# Altium footprint library IC_QFN.PcbLib: 25 footprints (part 2 of 3)
Each footprint in its own frame and in the unit in brackets; x right, y up, seen from the top. Pads: shape width x height; smd on the part's side, far side on the other; paste and mask are expansions set on the pad; w line width, h text height; cw(c..) or ccw(c..) is an arc to the next point about the centre after c.
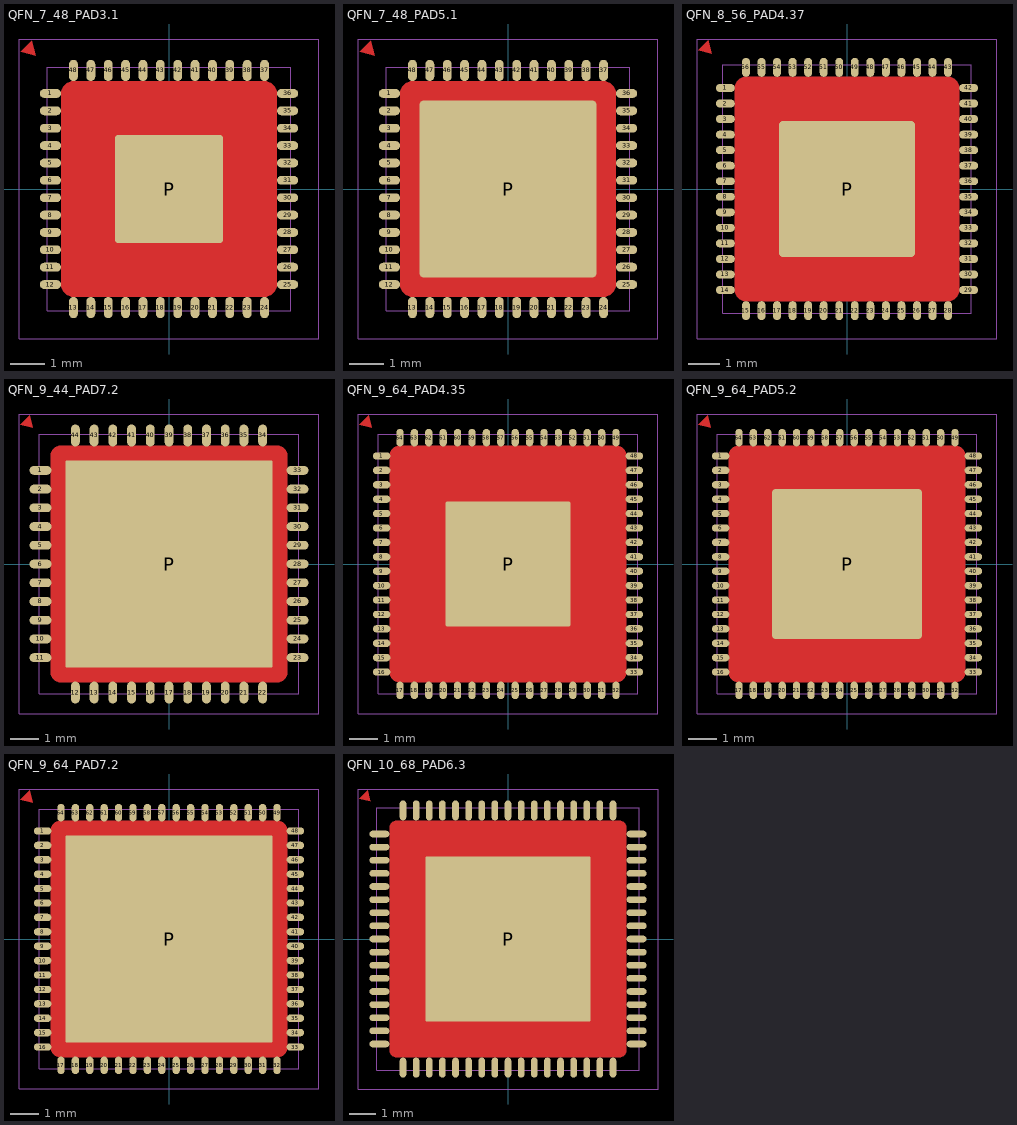
[diagram p1: the footprints below, top view; thin cyan lines are the x and y axes]

## QFN_7_48_PAD3.1 [mm]
pads (49):
  oval 0.61x0.254 smd mask+0.051: 1(-3.413,2.75) 2(-3.413,2.25) 3(-3.413,1.75) 4(-3.413,1.25) 5(-3.413,0.75) 6(-3.413,0.25) 7(-3.413,-0.25) 8(-3.413,-0.75) 9(-3.413,-1.25) 10(-3.413,-1.75) 11(-3.413,-2.25) 12(-3.413,-2.75) 25(3.413,-2.75) 26(3.413,-2.25) 27(3.413,-1.75) 28(3.413,-1.25) 29(3.413,-0.75) 30(3.413,-0.25) 31(3.413,0.25) 32(3.413,0.75) 33(3.413,1.25) 34(3.413,1.75) 35(3.413,2.25) 36(3.413,2.75)
  oval 0.254x0.61 smd mask+0.051: 13(-2.75,-3.413) 14(-2.25,-3.413) 15(-1.75,-3.413) 16(-1.25,-3.413) 17(-0.75,-3.413) 18(-0.25,-3.413) 19(0.25,-3.413) 20(0.75,-3.413) 21(1.25,-3.413) 22(1.75,-3.413) 23(2.25,-3.413) 24(2.75,-3.413) 37(2.75,3.413) 38(2.25,3.413) 39(1.75,3.413) 40(1.25,3.413) 41(0.75,3.413) 42(0.25,3.413) 43(-0.25,3.413) 44(-0.75,3.413) 45(-1.25,3.413) 46(-1.75,3.413) 47(-2.25,3.413) 48(-2.75,3.413)
  rrect5% 3.1x3.1 smd paste-7.62 mask+0.051: P(0,0)
Top Layer:
  region: -3.842,3.842 -3.95,4.273 -4.273,3.95
  pour cut-out: -2.75,3.099 -2.819,3.099 -2.948,3.046 -3.046,2.948 -3.099,2.819 -3.099,2.75 -3.099,-2.75 -3.099,-2.819 -3.046,-2.948 -2.948,-3.046 -2.819,-3.099 -2.75,-3.099 2.75,-3.099 2.819,-3.099 2.948,-3.046 3.046,-2.948 3.099,-2.819 3.099,-2.75 3.099,2.75 3.099,2.819 3.046,2.948 2.948,3.046 2.819,3.099 2.75,3.099
Top Paste:
  rectangle: -0.432,-0.432 0.432,0.432
  rectangle: -0.432,0.635 0.432,1.499
  rectangle: 0.635,-0.432 1.499,0.432
  rectangle: 0.635,0.635 1.499,1.499
  region: -0.635,0.635 -0.635,1.499 -1.499,1.499 -1.499,0.635
  region: -0.635,0.432 -1.499,0.432 -1.499,-0.432 -0.635,-0.432
  region: -0.635,-0.635 -1.499,-0.635 -1.499,-1.499 -0.635,-1.499
  region: -0.432,-0.635 -0.432,-1.499 0.432,-1.499 0.432,-0.635
  region: 0.635,-0.635 0.635,-1.499 1.499,-1.499 1.499,-0.635
Top Component Outline:
  lines w0.025: -4.318,-4.318 4.318,-4.318 4.318,4.318 -4.318,4.318 -4.318,-4.318
Top 3D Body (Mech16):
  lines w0.025: -3.5,-3.5 3.5,-3.5 3.5,3.5 -3.5,3.5 -3.5,-3.5
3D body: height 0.25, standoff 0, extent -3.525,2.623 -3.271,2.877
3D body: height 0.89, standoff 0, extent -3.5,-3.5 3.5,3.5
3D body: height 0.25, standoff 0, extent -3.525,2.123 -3.271,2.377
3D body: height 0.25, standoff 0, extent -3.525,1.623 -3.271,1.877
3D body: height 0.25, standoff 0, extent -3.525,1.123 -3.271,1.377
3D body: height 0.25, standoff 0, extent -3.525,0.623 -3.271,0.877
3D body: height 0.25, standoff 0, extent -3.525,0.123 -3.271,0.377
3D body: height 0.25, standoff 0, extent -3.525,-0.377 -3.271,-0.123
3D body: height 0.25, standoff 0, extent -3.525,-0.877 -3.271,-0.623
3D body: height 0.25, standoff 0, extent -3.525,-1.377 -3.271,-1.123
3D body: height 0.25, standoff 0, extent -3.525,-1.877 -3.271,-1.623
3D body: height 0.25, standoff 0, extent -3.525,-2.377 -3.271,-2.123
3D body: height 0.25, standoff 0, extent -3.525,-2.877 -3.271,-2.623
3D body: height 0.25, standoff 0, extent 2.623,-3.525 2.877,-3.271
3D body: height 0.25, standoff 0, extent 2.123,-3.525 2.377,-3.271
3D body: height 0.25, standoff 0, extent 1.623,-3.525 1.877,-3.271
3D body: height 0.25, standoff 0, extent 1.123,-3.525 1.377,-3.271
3D body: height 0.25, standoff 0, extent 0.623,-3.525 0.877,-3.271
3D body: height 0.25, standoff 0, extent 0.123,-3.525 0.377,-3.271
3D body: height 0.25, standoff 0, extent -0.377,-3.525 -0.123,-3.271
3D body: height 0.25, standoff 0, extent -0.877,-3.525 -0.623,-3.271
3D body: height 0.25, standoff 0, extent -1.377,-3.525 -1.123,-3.271
3D body: height 0.25, standoff 0, extent -1.877,-3.525 -1.623,-3.271
3D body: height 0.25, standoff 0, extent -2.377,-3.525 -2.123,-3.271
3D body: height 0.25, standoff 0, extent -2.877,-3.525 -2.623,-3.271
3D body: height 0.25, standoff 0, extent 3.271,2.623 3.525,2.877
3D body: height 0.25, standoff 0, extent 3.271,2.123 3.525,2.377
3D body: height 0.25, standoff 0, extent 3.271,1.623 3.525,1.877
3D body: height 0.25, standoff 0, extent 3.271,1.123 3.525,1.377
3D body: height 0.25, standoff 0, extent 3.271,0.623 3.525,0.877
3D body: height 0.25, standoff 0, extent 3.271,0.123 3.525,0.377
3D body: height 0.25, standoff 0, extent 3.271,-0.377 3.525,-0.123
3D body: height 0.25, standoff 0, extent 3.271,-0.877 3.525,-0.623
3D body: height 0.25, standoff 0, extent 3.271,-1.377 3.525,-1.123
3D body: height 0.25, standoff 0, extent 3.271,-1.877 3.525,-1.623
3D body: height 0.25, standoff 0, extent 3.271,-2.377 3.525,-2.123
3D body: height 0.25, standoff 0, extent 3.271,-2.877 3.525,-2.623
3D body: height 0.25, standoff 0, extent -2.877,3.271 -2.623,3.525
3D body: height 0.25, standoff 0, extent -2.377,3.271 -2.123,3.525
3D body: height 0.25, standoff 0, extent -1.877,3.271 -1.623,3.525
3D body: height 0.25, standoff 0, extent -1.377,3.271 -1.123,3.525
3D body: height 0.25, standoff 0, extent -0.877,3.271 -0.623,3.525
3D body: height 0.25, standoff 0, extent -0.377,3.271 -0.123,3.525
3D body: height 0.25, standoff 0, extent 0.123,3.271 0.377,3.525
3D body: height 0.25, standoff 0, extent 0.623,3.271 0.877,3.525
3D body: height 0.25, standoff 0, extent 1.123,3.271 1.377,3.525
3D body: height 0.25, standoff 0, extent 1.623,3.271 1.877,3.525
3D body: height 0.25, standoff 0, extent 2.123,3.271 2.377,3.525
3D body: height 0.25, standoff 0, extent 2.623,3.271 2.877,3.525

## QFN_7_48_PAD5.1 [mm]
pads (49):
  oval 0.61x0.254 smd mask+0.051: 1(-3.413,2.75) 2(-3.413,2.25) 3(-3.413,1.75) 4(-3.413,1.25) 5(-3.413,0.75) 6(-3.413,0.25) 7(-3.413,-0.25) 8(-3.413,-0.75) 9(-3.413,-1.25) 10(-3.413,-1.75) 11(-3.413,-2.25) 12(-3.413,-2.75) 25(3.413,-2.75) 26(3.413,-2.25) 27(3.413,-1.75) 28(3.413,-1.25) 29(3.413,-0.75) 30(3.413,-0.25) 31(3.413,0.25) 32(3.413,0.75) 33(3.413,1.25) 34(3.413,1.75) 35(3.413,2.25) 36(3.413,2.75)
  oval 0.254x0.61 smd mask+0.051: 13(-2.75,-3.413) 14(-2.25,-3.413) 15(-1.75,-3.413) 16(-1.25,-3.413) 17(-0.75,-3.413) 18(-0.25,-3.413) 19(0.25,-3.413) 20(0.75,-3.413) 21(1.25,-3.413) 22(1.75,-3.413) 23(2.25,-3.413) 24(2.75,-3.413) 37(2.75,3.413) 38(2.25,3.413) 39(1.75,3.413) 40(1.25,3.413) 41(0.75,3.413) 42(0.25,3.413) 43(-0.25,3.413) 44(-0.75,3.413) 45(-1.25,3.413) 46(-1.75,3.413) 47(-2.25,3.413) 48(-2.75,3.413)
  rrect5% 5.1x5.1 smd paste-7.62 mask+0.051: P(0,0)
Top Layer:
  pour cut-out: -2.75,3.099 -2.819,3.099 -2.948,3.046 -3.046,2.948 -3.099,2.819 -3.099,2.75 -3.099,-2.75 -3.099,-2.819 -3.046,-2.948 -2.948,-3.046 -2.819,-3.099 -2.75,-3.099 2.75,-3.099 2.819,-3.099 2.948,-3.046 3.046,-2.948 3.099,-2.819 3.099,-2.75 3.099,2.75 3.099,2.819 3.046,2.948 2.948,3.046 2.819,3.099 2.75,3.099
  region: -3.842,3.842 -3.95,4.273 -4.273,3.95
Top Paste:
  rectangle: -0.635,-0.635 0.635,0.635
  rectangle: -0.635,1.016 0.635,2.286
  rectangle: -2.286,1.016 -1.016,2.286
  region: -1.016,-2.286 -1.016,-1.016 -2.286,-1.016 -2.286,-2.286
  region: -1.016,-0.635 -1.016,0.635 -2.286,0.635 -2.286,-0.635
  region: 2.286,-1.016 1.016,-1.016 1.016,-2.286 2.286,-2.286
  region: 0.635,-1.016 -0.635,-1.016 -0.635,-2.286 0.635,-2.286
  region: 1.016,2.286 1.016,1.016 2.286,1.016 2.286,2.286
  region: 1.016,0.635 1.016,-0.635 2.286,-0.635 2.286,0.635
Top Component Outline:
  lines w0.025: -4.318,-4.318 -4.318,4.318 4.318,4.318 4.318,-4.318 -4.318,-4.318
Top 3D Body (Mech16):
  lines w0.025: -3.5,-3.5 -3.5,3.5 3.5,3.5 3.5,-3.5 -3.5,-3.5
3D body: height 0.25, standoff 0, extent 2.623,3.271 2.877,3.525
3D body: height 0.25, standoff 0, extent 2.123,3.271 2.377,3.525
3D body: height 0.25, standoff 0, extent 1.623,3.271 1.877,3.525
3D body: height 0.25, standoff 0, extent 1.123,3.271 1.377,3.525
3D body: height 0.25, standoff 0, extent 0.623,3.271 0.877,3.525
3D body: height 0.25, standoff 0, extent 0.123,3.271 0.377,3.525
3D body: height 0.25, standoff 0, extent -0.377,3.271 -0.123,3.525
3D body: height 0.25, standoff 0, extent -0.877,3.271 -0.623,3.525
3D body: height 0.25, standoff 0, extent -1.377,3.271 -1.123,3.525
3D body: height 0.25, standoff 0, extent -1.877,3.271 -1.623,3.525
3D body: height 0.25, standoff 0, extent -2.377,3.271 -2.123,3.525
3D body: height 0.25, standoff 0, extent -2.877,3.271 -2.623,3.525
3D body: height 0.25, standoff 0, extent 3.271,-2.877 3.525,-2.623
3D body: height 0.25, standoff 0, extent 3.271,-2.377 3.525,-2.123
3D body: height 0.25, standoff 0, extent 3.271,-1.877 3.525,-1.623
3D body: height 0.25, standoff 0, extent 3.271,-1.377 3.525,-1.123
3D body: height 0.25, standoff 0, extent 3.271,-0.877 3.525,-0.623
3D body: height 0.25, standoff 0, extent 3.271,-0.377 3.525,-0.123
3D body: height 0.25, standoff 0, extent 3.271,0.123 3.525,0.377
3D body: height 0.25, standoff 0, extent 3.271,0.623 3.525,0.877
3D body: height 0.25, standoff 0, extent 3.271,1.123 3.525,1.377
3D body: height 0.25, standoff 0, extent 3.271,1.623 3.525,1.877
3D body: height 0.25, standoff 0, extent 3.271,2.123 3.525,2.377
3D body: height 0.25, standoff 0, extent 3.271,2.623 3.525,2.877
3D body: height 0.25, standoff 0, extent -2.877,-3.525 -2.623,-3.271
3D body: height 0.25, standoff 0, extent -2.377,-3.525 -2.123,-3.271
3D body: height 0.25, standoff 0, extent -1.877,-3.525 -1.623,-3.271
3D body: height 0.25, standoff 0, extent -1.377,-3.525 -1.123,-3.271
3D body: height 0.25, standoff 0, extent -0.877,-3.525 -0.623,-3.271
3D body: height 0.25, standoff 0, extent -0.377,-3.525 -0.123,-3.271
3D body: height 0.25, standoff 0, extent 0.123,-3.525 0.377,-3.271
3D body: height 0.25, standoff 0, extent 0.623,-3.525 0.877,-3.271
3D body: height 0.25, standoff 0, extent 1.123,-3.525 1.377,-3.271
3D body: height 0.25, standoff 0, extent 1.623,-3.525 1.877,-3.271
3D body: height 0.25, standoff 0, extent 2.123,-3.525 2.377,-3.271
3D body: height 0.25, standoff 0, extent 2.623,-3.525 2.877,-3.271
3D body: height 0.25, standoff 0, extent -3.525,-2.877 -3.271,-2.623
3D body: height 0.25, standoff 0, extent -3.525,-2.377 -3.271,-2.123
3D body: height 0.25, standoff 0, extent -3.525,-1.877 -3.271,-1.623
3D body: height 0.25, standoff 0, extent -3.525,-1.377 -3.271,-1.123
3D body: height 0.25, standoff 0, extent -3.525,-0.877 -3.271,-0.623
3D body: height 0.25, standoff 0, extent -3.525,-0.377 -3.271,-0.123
3D body: height 0.25, standoff 0, extent -3.525,0.123 -3.271,0.377
3D body: height 0.25, standoff 0, extent -3.525,0.623 -3.271,0.877
3D body: height 0.25, standoff 0, extent -3.525,1.123 -3.271,1.377
3D body: height 0.25, standoff 0, extent -3.525,1.623 -3.271,1.877
3D body: height 0.25, standoff 0, extent -3.525,2.123 -3.271,2.377
3D body: height 0.89, standoff 0, extent -3.5,-3.5 3.5,3.5
3D body: height 0.25, standoff 0, extent -3.525,2.623 -3.271,2.877

## QFN_8_56_PAD4.37 [mm]
pads (57):
  oval 0.61x0.254 smd paste+0 mask+0.051: 1(-3.913,3.25) 2(-3.913,2.75) 3(-3.913,2.25) 4(-3.913,1.75) 5(-3.913,1.25) 6(-3.913,0.75) 7(-3.913,0.25) 8(-3.913,-0.25) 9(-3.913,-0.75) 10(-3.913,-1.25) 11(-3.913,-1.75) 12(-3.913,-2.25) 13(-3.913,-2.75) 14(-3.913,-3.25) 29(3.913,-3.25) 30(3.913,-2.75) 31(3.913,-2.25) 32(3.913,-1.75) 33(3.913,-1.25) 34(3.913,-0.75) 35(3.913,-0.25) 36(3.913,0.25) 37(3.913,0.75) 38(3.913,1.25) 39(3.913,1.75) 40(3.913,2.25) 41(3.913,2.75) 42(3.913,3.25)
  oval 0.254x0.61 smd paste+0 mask+0.051: 15(-3.25,-3.913) 16(-2.75,-3.913) 17(-2.25,-3.913) 18(-1.75,-3.913) 19(-1.25,-3.913) 20(-0.75,-3.913) 21(-0.25,-3.913) 22(0.25,-3.913) 23(0.75,-3.913) 24(1.25,-3.913) 25(1.75,-3.913) 26(2.25,-3.913) 27(2.75,-3.913) 28(3.25,-3.913) 43(3.25,3.913) 44(2.75,3.913) 45(2.25,3.913) 46(1.75,3.913) 47(1.25,3.913) 48(0.75,3.913) 49(0.25,3.913) 50(-0.25,3.913) 51(-0.75,3.913) 52(-1.25,3.913) 53(-1.75,3.913) 54(-2.25,3.913) 55(-2.75,3.913) 56(-3.25,3.913)
  rrect5% 4.37x4.37 smd paste-5.08 mask+0.051: P(0,0)
Top Layer:
  region: -4.35,4.35 -4.458,4.781 -4.781,4.458
  pour cut-out: -3.25,3.607 -3.321,3.607 -3.452,3.552 -3.552,3.452 -3.607,3.321 -3.607,3.25 -3.607,-3.25 -3.607,-3.321 -3.552,-3.452 -3.452,-3.552 -3.321,-3.607 -3.25,-3.607 3.25,-3.607 3.321,-3.607 3.452,-3.552 3.552,-3.452 3.607,-3.321 3.607,-3.25 3.607,3.25 3.607,3.321 3.552,3.452 3.452,3.552 3.321,3.607 3.25,3.607
Top Paste:
  region: 1.016,0.635 1.016,-0.635 2.032,-0.635 2.032,0.635
  region: 1.016,2.032 1.016,1.016 2.032,1.016 2.032,2.032
  region: 0.635,-1.016 -0.635,-1.016 -0.635,-2.032 0.635,-2.032
  region: 2.032,-1.016 1.016,-1.016 1.016,-2.032 2.032,-2.032
  region: -1.016,-0.635 -1.016,0.635 -2.032,0.635 -2.032,-0.635
  region: -1.016,-2.032 -1.016,-1.016 -2.032,-1.016 -2.032,-2.032
  rectangle: -2.032,1.016 -1.016,2.032
  rectangle: -0.635,1.016 0.635,2.032
  rectangle: -0.635,-0.635 0.635,0.635
Top Component Outline:
  lines w0.025: -4.826,-4.826 4.826,-4.826 4.826,4.826 -4.826,4.826 -4.826,-4.826
Top 3D Body (Mech16):
  lines w0.025: -4,-4 4,-4 4,4 -4,4 -4,-4
3D body: height 0.89, standoff 0, extent -4,-4 4,4
3D body: height 0.25, standoff 0, extent 3.759,-2.377 4.013,-2.123
3D body: height 0.25, standoff 0, extent 3.759,-1.877 4.013,-1.623
3D body: height 0.25, standoff 0, extent 3.759,-1.377 4.013,-1.123
3D body: height 0.25, standoff 0, extent 3.759,-0.877 4.013,-0.623
3D body: height 0.25, standoff 0, extent 3.759,-0.377 4.013,-0.123
3D body: height 0.25, standoff 0, extent 3.759,0.123 4.013,0.377
3D body: height 0.25, standoff 0, extent 3.759,0.623 4.013,0.877
3D body: height 0.25, standoff 0, extent 3.759,1.123 4.013,1.377
3D body: height 0.25, standoff 0, extent 3.759,1.623 4.013,1.877
3D body: height 0.25, standoff 0, extent 3.759,2.123 4.013,2.377
3D body: height 0.25, standoff 0, extent 3.759,2.623 4.013,2.877
3D body: height 0.25, standoff 0, extent 3.759,3.123 4.013,3.377
3D body: height 0.25, standoff 0, extent 3.759,-2.878 4.013,-2.624
3D body: height 0.25, standoff 0, extent 3.759,-3.378 4.013,-3.124
3D body: height 0.25, standoff 0, extent 3.124,3.759 3.378,4.013
3D body: height 0.25, standoff 0, extent 2.624,3.759 2.878,4.013
3D body: height 0.25, standoff 0, extent -3.377,3.759 -3.123,4.013
3D body: height 0.25, standoff 0, extent -2.877,3.759 -2.623,4.013
3D body: height 0.25, standoff 0, extent -2.377,3.759 -2.123,4.013
3D body: height 0.25, standoff 0, extent -1.877,3.759 -1.623,4.013
3D body: height 0.25, standoff 0, extent -1.377,3.759 -1.123,4.013
3D body: height 0.25, standoff 0, extent -0.877,3.759 -0.623,4.013
3D body: height 0.25, standoff 0, extent -0.377,3.759 -0.123,4.013
3D body: height 0.25, standoff 0, extent 0.123,3.759 0.377,4.013
3D body: height 0.25, standoff 0, extent 0.623,3.759 0.877,4.013
3D body: height 0.25, standoff 0, extent 1.123,3.759 1.377,4.013
3D body: height 0.25, standoff 0, extent 1.623,3.759 1.877,4.013
3D body: height 0.25, standoff 0, extent 2.123,3.759 2.377,4.013
3D body: height 0.25, standoff 0, extent -4.013,3.124 -3.759,3.378
3D body: height 0.25, standoff 0, extent -4.013,2.624 -3.759,2.878
3D body: height 0.25, standoff 0, extent -4.013,-3.377 -3.759,-3.123
3D body: height 0.25, standoff 0, extent -4.013,-2.877 -3.759,-2.623
3D body: height 0.25, standoff 0, extent -4.013,-2.377 -3.759,-2.123
3D body: height 0.25, standoff 0, extent -4.013,-1.877 -3.759,-1.623
3D body: height 0.25, standoff 0, extent -4.013,-1.377 -3.759,-1.123
3D body: height 0.25, standoff 0, extent -4.013,-0.877 -3.759,-0.623
3D body: height 0.25, standoff 0, extent -4.013,-0.377 -3.759,-0.123
3D body: height 0.25, standoff 0, extent -4.013,0.123 -3.759,0.377
3D body: height 0.25, standoff 0, extent -4.013,0.623 -3.759,0.877
3D body: height 0.25, standoff 0, extent -4.013,1.123 -3.759,1.377
3D body: height 0.25, standoff 0, extent -4.013,1.623 -3.759,1.877
3D body: height 0.25, standoff 0, extent -4.013,2.123 -3.759,2.377
3D body: height 0.25, standoff 0, extent -3.378,-4.013 -3.124,-3.759
3D body: height 0.25, standoff 0, extent -2.878,-4.013 -2.624,-3.759
3D body: height 0.25, standoff 0, extent 3.123,-4.013 3.377,-3.759
3D body: height 0.25, standoff 0, extent 2.623,-4.013 2.877,-3.759
3D body: height 0.25, standoff 0, extent 2.123,-4.013 2.377,-3.759
3D body: height 0.25, standoff 0, extent 1.623,-4.013 1.877,-3.759
3D body: height 0.25, standoff 0, extent 1.123,-4.013 1.377,-3.759
3D body: height 0.25, standoff 0, extent 0.623,-4.013 0.877,-3.759
3D body: height 0.25, standoff 0, extent 0.123,-4.013 0.377,-3.759
3D body: height 0.25, standoff 0, extent -0.377,-4.013 -0.123,-3.759
3D body: height 0.25, standoff 0, extent -0.877,-4.013 -0.623,-3.759
3D body: height 0.25, standoff 0, extent -1.377,-4.013 -1.123,-3.759
3D body: height 0.25, standoff 0, extent -1.877,-4.013 -1.623,-3.759
3D body: height 0.25, standoff 0, extent -2.377,-4.013 -2.123,-3.759

## QFN_9_44_PAD7.2 [mil]
pads (45):
  oval 30x12 smd mask+2: 1(-175.69,127.95) 2(-175.69,102.36) 3(-175.69,76.77) 4(-175.69,51.18) 5(-175.69,25.59) 6(-175.69,0) 7(-175.69,-25.59) 8(-175.69,-51.18) 9(-175.69,-76.77) 10(-175.69,-102.36) 11(-175.69,-127.95) 23(175.69,-127.95) 24(175.69,-102.36) 25(175.69,-76.77) 26(175.69,-51.18) 27(175.69,-25.59) 28(175.69,0) 29(175.69,25.59) 30(175.69,51.18) 31(175.69,76.77) 32(175.69,102.36) 33(175.69,127.95)
  oval 12x30 smd mask+2: 12(-127.95,-175.69) 13(-102.36,-175.69) 14(-76.77,-175.69) 15(-51.18,-175.69) 16(-25.59,-175.69) 17(0,-175.69) 18(25.59,-175.69) 19(51.18,-175.69) 20(76.77,-175.69) 21(102.36,-175.69) 22(127.95,-175.69) 34(127.95,175.69) 35(102.36,175.69) 36(76.77,175.69) 37(51.18,175.69) 38(25.59,175.69) 39(0,175.69) 40(-25.59,175.69) 41(-51.18,175.69) 42(-76.77,175.69) 43(-102.36,175.69) 44(-127.95,175.69)
  rrect2% 283.46x283.46 smd paste-500 mask+2: P(0,0)
Top Layer:
  pour cut-out: 147.64,161.42 150.38,161.42 155.44,159.32 159.32,155.44 161.42,150.38 161.42,147.64 161.42,-147.64 161.42,-150.38 159.32,-155.44 155.44,-159.32 150.38,-161.42 147.64,-161.42 -147.64,-161.42 -150.38,-161.42 -155.44,-159.32 -159.32,-155.44 -161.42,-150.38 -161.42,-147.64 -161.42,147.64 -161.42,150.38 -159.32,155.44 -155.44,159.32 -150.38,161.42 -147.64,161.42
  region: -186.26,186.26 -190.5,203.23 -203.23,190.51
Top Paste:
  rectangle: -20,-20 20,20
  rectangle: 30,-20 70,20
  rectangle: 30,-70 70,-30
  rectangle: -20,-70 20,-30
  rectangle: -20,-130 20,-90
  rectangle: 30,-130 70,-90
  region: 70,30 70,70 30,70 30,30
  region: -30,70 -70,70 -70,30 -30,30
  region: -130,-90 -130,-130 -90,-130 -90,-90
  region: -70,-30 -70,-70 -30,-70 -30,-30
  region: -70,-90 -70,-130 -30,-130 -30,-90
  region: 20,70 -20,70 -20,30 20,30
  region: -70,20 -70,-20 -30,-20 -30,20
  rectangle: 90,-70 130,-30
  rectangle: 90,-130 130,-90
  region: 130,30 130,70 90,70 90,30
  region: 130,-20 130,20 90,20 90,-20
  region: 70,90 70,130 30,130 30,90
  region: 130,90 130,130 90,130 90,90
  region: -30,130 -70,130 -70,90 -30,90
  region: 20,130 -20,130 -20,90 20,90
  region: -90,70 -130,70 -130,30 -90,30
  region: -90,130 -130,130 -130,90 -90,90
  region: -130,-30 -130,-70 -90,-70 -90,-30
  region: -130,20 -130,-20 -90,-20 -90,20
Top Component Outline:
  lines w1: -205,-205 -205,205 205,205 205,-205 -205,-205
Top 3D Body (Mech16):
  lines w1: -177.17,-177.17 -177.17,177.17 177.17,177.17 177.17,-177.17 -177.17,-177.17
3D body: height 10, standoff 0, extent 122.95,167.74 132.95,177.74
3D body: height 10, standoff 0, extent 97.36,167.74 107.36,177.74
3D body: height 10, standoff 0, extent 71.77,167.74 81.77,177.74
3D body: height 10, standoff 0, extent 46.18,167.74 56.18,177.74
3D body: height 10, standoff 0, extent 20.59,167.74 30.59,177.74
3D body: height 10, standoff 0, extent -5,167.74 5,177.74
3D body: height 10, standoff 0, extent -132.95,167.74 -122.95,177.74
3D body: height 10, standoff 0, extent -107.36,167.74 -97.36,177.74
3D body: height 10, standoff 0, extent -81.77,167.74 -71.77,177.74
3D body: height 10, standoff 0, extent -56.18,167.74 -46.18,177.74
3D body: height 10, standoff 0, extent -30.59,167.74 -20.59,177.74
3D body: height 10, standoff 0, extent 167.74,-132.95 177.74,-122.95
3D body: height 10, standoff 0, extent 167.74,-107.36 177.74,-97.36
3D body: height 10, standoff 0, extent 167.74,-81.77 177.74,-71.77
3D body: height 10, standoff 0, extent 167.74,-56.18 177.74,-46.18
3D body: height 10, standoff 0, extent 167.74,-30.59 177.74,-20.59
3D body: height 10, standoff 0, extent 167.74,-5 177.74,5
3D body: height 10, standoff 0, extent 167.74,122.95 177.74,132.95
3D body: height 10, standoff 0, extent 167.74,97.36 177.74,107.36
3D body: height 10, standoff 0, extent 167.74,71.77 177.74,81.77
3D body: height 10, standoff 0, extent 167.74,46.18 177.74,56.18
3D body: height 10, standoff 0, extent 167.74,20.59 177.74,30.59
3D body: height 10, standoff 0, extent -132.95,-177.74 -122.95,-167.74
3D body: height 10, standoff 0, extent -107.36,-177.74 -97.36,-167.74
3D body: height 10, standoff 0, extent -81.77,-177.74 -71.77,-167.74
3D body: height 10, standoff 0, extent -56.18,-177.74 -46.18,-167.74
3D body: height 10, standoff 0, extent -30.59,-177.74 -20.59,-167.74
3D body: height 10, standoff 0, extent -5,-177.74 5,-167.74
3D body: height 10, standoff 0, extent 122.95,-177.74 132.95,-167.74
3D body: height 10, standoff 0, extent 97.36,-177.74 107.36,-167.74
3D body: height 10, standoff 0, extent 71.77,-177.74 81.77,-167.74
3D body: height 10, standoff 0, extent 46.18,-177.74 56.18,-167.74
3D body: height 10, standoff 0, extent 20.59,-177.74 30.59,-167.74
3D body: height 10, standoff 0, extent -177.74,-30.59 -167.74,-20.59
3D body: height 10, standoff 0, extent -177.74,-56.18 -167.74,-46.18
3D body: height 10, standoff 0, extent -177.74,-81.77 -167.74,-71.77
3D body: height 10, standoff 0, extent -177.74,-107.36 -167.74,-97.36
3D body: height 10, standoff 0, extent -177.74,-132.95 -167.74,-122.95
3D body: height 10, standoff 0, extent -177.74,-5 -167.74,5
3D body: height 10, standoff 0, extent -177.74,20.59 -167.74,30.59
3D body: height 10, standoff 0, extent -177.74,46.18 -167.74,56.18
3D body: height 10, standoff 0, extent -177.74,71.77 -167.74,81.77
3D body: height 10, standoff 0, extent -177.74,97.36 -167.74,107.36
3D body: height 10, standoff 0, extent -177.74,122.95 -167.74,132.95
3D body: height 35, standoff 0, extent -177.17,-177.17 177.17,177.17

## QFN_9_64_PAD4.35 [mil]
pads (65):
  oval 24x10 smd paste+0 mask+2: 1(-172.74,147.64) 2(-172.74,127.95) 3(-172.74,108.27) 4(-172.74,88.58) 5(-172.74,68.9) 6(-172.74,49.21) 7(-172.74,29.53) 8(-172.74,9.84) 9(-172.74,-9.84) 10(-172.74,-29.53) 11(-172.74,-49.21) 12(-172.74,-68.9) 13(-172.74,-88.58) 14(-172.74,-108.27) 15(-172.74,-127.95) 16(-172.74,-147.64) 33(172.74,-147.64) 34(172.74,-127.95) 35(172.74,-108.27) 36(172.74,-88.58) 37(172.74,-68.9) 38(172.74,-49.21) 39(172.74,-29.53) 40(172.74,-9.84) 41(172.74,9.84) 42(172.74,29.53) 43(172.74,49.21) 44(172.74,68.9) 45(172.74,88.58) 46(172.74,108.27) 47(172.74,127.95) 48(172.74,147.64)
  oval 10x24 smd paste+0 mask+2: 17(-147.64,-172.74) 18(-127.95,-172.74) 19(-108.27,-172.74) 20(-88.58,-172.74) 21(-68.9,-172.74) 22(-49.21,-172.74) 23(-29.53,-172.74) 24(-9.84,-172.74) 25(9.84,-172.74) 26(29.53,-172.74) 27(49.21,-172.74) 28(68.9,-172.74) 29(88.58,-172.74) 30(108.27,-172.74) 31(127.95,-172.74) 32(147.64,-172.74) 49(147.64,172.74) 50(127.95,172.74) 51(108.27,172.74) 52(88.58,172.74) 53(68.9,172.74) 54(49.21,172.74) 55(29.53,172.74) 56(9.84,172.74) 57(-9.84,172.74) 58(-29.53,172.74) 59(-49.21,172.74) 60(-68.9,172.74) 61(-88.58,172.74) 62(-108.27,172.74) 63(-127.95,172.74) 64(-147.64,172.74)
  rrect4% 171.26x171.26 smd paste-500 mask+2: P(0,0)
Top Layer:
  region: -186.26,186.26 -190.5,203.23 -203.23,190.51
  pour cut-out: 147.64,161.42 150.38,161.42 155.44,159.32 159.32,155.44 161.42,150.38 161.42,147.64 161.42,-147.64 161.42,-150.38 159.32,-155.44 155.44,-159.32 150.38,-161.42 147.64,-161.42 -147.64,-161.42 -150.38,-161.42 -155.44,-159.32 -159.32,-155.44 -161.42,-150.38 -161.42,-147.64 -161.42,147.64 -161.42,150.38 -159.32,155.44 -155.44,159.32 -150.38,161.42 -147.64,161.42
Top Paste:
  rectangle: -25,-25 25,25
  rectangle: -25,40 25,80
  rectangle: -80,40 -40,80
  region: -40,-80 -40,-40 -80,-40 -80,-80
  region: -40,-25 -40,25 -80,25 -80,-25
  region: 80,-40 40,-40 40,-80 80,-80
  region: 25,-40 -25,-40 -25,-80 25,-80
  region: 40,80 40,40 80,40 80,80
  region: 40,25 40,-25 80,-25 80,25
Top Component Outline:
  lines w1: -205,-205 205,-205 205,205 -205,205 -205,-205
Top 3D Body (Mech16):
  lines w1: -177.17,-177.17 177.17,-177.17 177.17,177.17 -177.17,177.17 -177.17,-177.17
3D body: height 10, standoff 0, extent -132.98,-177.5 -122.98,-167.5
3D body: height 10, standoff 0, extent -152.67,-177.5 -142.67,-167.5
3D body: height 10, standoff 0, extent -113.3,-177.5 -103.3,-167.5
3D body: height 10, standoff 0, extent -93.61,-177.5 -83.61,-167.5
3D body: height 10, standoff 0, extent 142.64,-177.5 152.64,-167.5
3D body: height 10, standoff 0, extent 122.95,-177.5 132.95,-167.5
3D body: height 10, standoff 0, extent 103.27,-177.5 113.27,-167.5
3D body: height 10, standoff 0, extent 83.58,-177.5 93.58,-167.5
3D body: height 10, standoff 0, extent 63.9,-177.5 73.9,-167.5
3D body: height 10, standoff 0, extent 44.21,-177.5 54.21,-167.5
3D body: height 10, standoff 0, extent 24.53,-177.5 34.53,-167.5
3D body: height 10, standoff 0, extent 4.84,-177.5 14.84,-167.5
3D body: height 10, standoff 0, extent -14.84,-177.5 -4.84,-167.5
3D body: height 10, standoff 0, extent -34.53,-177.5 -24.53,-167.5
3D body: height 10, standoff 0, extent -54.21,-177.5 -44.21,-167.5
3D body: height 10, standoff 0, extent -73.9,-177.5 -63.9,-167.5
3D body: height 10, standoff 0, extent -177.5,122.98 -167.5,132.98
3D body: height 10, standoff 0, extent -177.5,142.67 -167.5,152.67
3D body: height 10, standoff 0, extent -177.5,103.3 -167.5,113.3
3D body: height 10, standoff 0, extent -177.5,83.61 -167.5,93.61
3D body: height 10, standoff 0, extent -177.5,-152.64 -167.5,-142.64
3D body: height 10, standoff 0, extent -177.5,-132.95 -167.5,-122.95
3D body: height 10, standoff 0, extent -177.5,-113.27 -167.5,-103.27
3D body: height 10, standoff 0, extent -177.5,-93.58 -167.5,-83.58
3D body: height 10, standoff 0, extent -177.5,-73.9 -167.5,-63.9
3D body: height 10, standoff 0, extent -177.5,-54.21 -167.5,-44.21
3D body: height 10, standoff 0, extent -177.5,-34.53 -167.5,-24.53
3D body: height 10, standoff 0, extent -177.5,-14.84 -167.5,-4.84
3D body: height 10, standoff 0, extent -177.5,4.84 -167.5,14.84
3D body: height 10, standoff 0, extent -177.5,24.53 -167.5,34.53
3D body: height 10, standoff 0, extent -177.5,44.21 -167.5,54.21
3D body: height 10, standoff 0, extent -177.5,63.9 -167.5,73.9
3D body: height 10, standoff 0, extent 122.98,167.5 132.98,177.5
3D body: height 10, standoff 0, extent 142.67,167.5 152.67,177.5
3D body: height 10, standoff 0, extent 103.3,167.5 113.3,177.5
3D body: height 10, standoff 0, extent 83.61,167.5 93.61,177.5
3D body: height 10, standoff 0, extent -152.64,167.5 -142.64,177.5
3D body: height 10, standoff 0, extent -132.95,167.5 -122.95,177.5
3D body: height 10, standoff 0, extent -113.27,167.5 -103.27,177.5
3D body: height 10, standoff 0, extent -93.58,167.5 -83.58,177.5
3D body: height 10, standoff 0, extent -73.9,167.5 -63.9,177.5
3D body: height 10, standoff 0, extent -54.21,167.5 -44.21,177.5
3D body: height 10, standoff 0, extent -34.53,167.5 -24.53,177.5
3D body: height 10, standoff 0, extent -14.84,167.5 -4.84,177.5
3D body: height 10, standoff 0, extent 4.84,167.5 14.84,177.5
3D body: height 10, standoff 0, extent 24.53,167.5 34.53,177.5
3D body: height 10, standoff 0, extent 44.21,167.5 54.21,177.5
3D body: height 10, standoff 0, extent 63.9,167.5 73.9,177.5
3D body: height 10, standoff 0, extent 167.5,-73.9 177.5,-63.9
3D body: height 10, standoff 0, extent 167.5,-54.21 177.5,-44.21
3D body: height 10, standoff 0, extent 167.5,-34.53 177.5,-24.53
3D body: height 10, standoff 0, extent 167.5,-14.84 177.5,-4.84
3D body: height 10, standoff 0, extent 167.5,4.84 177.5,14.84
3D body: height 10, standoff 0, extent 167.5,24.53 177.5,34.53
3D body: height 10, standoff 0, extent 167.5,44.21 177.5,54.21
3D body: height 10, standoff 0, extent 167.5,63.9 177.5,73.9
3D body: height 10, standoff 0, extent 167.5,83.58 177.5,93.58
3D body: height 10, standoff 0, extent 167.5,103.27 177.5,113.27
3D body: height 10, standoff 0, extent 167.5,122.95 177.5,132.95
3D body: height 10, standoff 0, extent 167.5,142.64 177.5,152.64
3D body: height 10, standoff 0, extent 167.5,-93.61 177.5,-83.61
3D body: height 10, standoff 0, extent 167.5,-113.3 177.5,-103.3
3D body: height 10, standoff 0, extent 167.5,-152.67 177.5,-142.67
3D body: height 10, standoff 0, extent 167.5,-132.98 177.5,-122.98
3D body: height 35, standoff 0, extent -177.17,-177.17 177.17,177.17

## QFN_9_64_PAD5.2 [mil]
pads (65):
  oval 24x10 smd paste+0 mask+2: 1(-172.74,147.64) 2(-172.74,127.95) 3(-172.74,108.27) 4(-172.74,88.58) 5(-172.74,68.9) 6(-172.74,49.21) 7(-172.74,29.53) 8(-172.74,9.84) 9(-172.74,-9.84) 10(-172.74,-29.53) 11(-172.74,-49.21) 12(-172.74,-68.9) 13(-172.74,-88.58) 14(-172.74,-108.27) 15(-172.74,-127.95) 16(-172.74,-147.64) 33(172.74,-147.64) 34(172.74,-127.95) 35(172.74,-108.27) 36(172.74,-88.58) 37(172.74,-68.9) 38(172.74,-49.21) 39(172.74,-29.53) 40(172.74,-9.84) 41(172.74,9.84) 42(172.74,29.53) 43(172.74,49.21) 44(172.74,68.9) 45(172.74,88.58) 46(172.74,108.27) 47(172.74,127.95) 48(172.74,147.64)
  oval 10x24 smd paste+0 mask+2: 17(-147.64,-172.74) 18(-127.95,-172.74) 19(-108.27,-172.74) 20(-88.58,-172.74) 21(-68.9,-172.74) 22(-49.21,-172.74) 23(-29.53,-172.74) 24(-9.84,-172.74) 25(9.84,-172.74) 26(29.53,-172.74) 27(49.21,-172.74) 28(68.9,-172.74) 29(88.58,-172.74) 30(108.27,-172.74) 31(127.95,-172.74) 32(147.64,-172.74) 49(147.64,172.74) 50(127.95,172.74) 51(108.27,172.74) 52(88.58,172.74) 53(68.9,172.74) 54(49.21,172.74) 55(29.53,172.74) 56(9.84,172.74) 57(-9.84,172.74) 58(-29.53,172.74) 59(-49.21,172.74) 60(-68.9,172.74) 61(-88.58,172.74) 62(-108.27,172.74) 63(-127.95,172.74) 64(-147.64,172.74)
  rrect4% 204.72x204.72 smd paste-500 mask+2: P(0,0)
Top Layer:
  pour cut-out: 147.64,161.42 150.38,161.42 155.44,159.32 159.32,155.44 161.42,150.38 161.42,147.64 161.42,-147.64 161.42,-150.38 159.32,-155.44 155.44,-159.32 150.38,-161.42 147.64,-161.42 -147.64,-161.42 -150.38,-161.42 -155.44,-159.32 -159.32,-155.44 -161.42,-150.38 -161.42,-147.64 -161.42,147.64 -161.42,150.38 -159.32,155.44 -155.44,159.32 -150.38,161.42 -147.64,161.42
  region: -186.26,186.26 -190.5,203.23 -203.23,190.51
Top Paste:
  rectangle: -25,-25 25,25
  rectangle: -25,40 25,80
  rectangle: -80,40 -40,80
  region: -40,-80 -40,-40 -80,-40 -80,-80
  region: -40,-25 -40,25 -80,25 -80,-25
  region: 80,-40 40,-40 40,-80 80,-80
  region: 25,-40 -25,-40 -25,-80 25,-80
  region: 40,80 40,40 80,40 80,80
  region: 40,25 40,-25 80,-25 80,25
Top Component Outline:
  lines w1: -205,-205 205,-205 205,205 -205,205 -205,-205
Top 3D Body (Mech16):
  lines w1: -177.17,-177.17 177.17,-177.17 177.17,177.17 -177.17,177.17 -177.17,-177.17
3D body: height 10, standoff 0, extent -132.98,-177.5 -122.98,-167.5
3D body: height 10, standoff 0, extent -152.67,-177.5 -142.67,-167.5
3D body: height 10, standoff 0, extent -113.3,-177.5 -103.3,-167.5
3D body: height 10, standoff 0, extent -93.61,-177.5 -83.61,-167.5
3D body: height 10, standoff 0, extent 142.64,-177.5 152.64,-167.5
3D body: height 10, standoff 0, extent 122.95,-177.5 132.95,-167.5
3D body: height 10, standoff 0, extent 103.27,-177.5 113.27,-167.5
3D body: height 10, standoff 0, extent 83.58,-177.5 93.58,-167.5
3D body: height 10, standoff 0, extent 63.9,-177.5 73.9,-167.5
3D body: height 10, standoff 0, extent 44.21,-177.5 54.21,-167.5
3D body: height 10, standoff 0, extent 24.53,-177.5 34.53,-167.5
3D body: height 10, standoff 0, extent 4.84,-177.5 14.84,-167.5
3D body: height 10, standoff 0, extent -14.84,-177.5 -4.84,-167.5
3D body: height 10, standoff 0, extent -34.53,-177.5 -24.53,-167.5
3D body: height 10, standoff 0, extent -54.21,-177.5 -44.21,-167.5
3D body: height 10, standoff 0, extent -73.9,-177.5 -63.9,-167.5
3D body: height 10, standoff 0, extent -177.5,122.98 -167.5,132.98
3D body: height 10, standoff 0, extent -177.5,142.67 -167.5,152.67
3D body: height 10, standoff 0, extent -177.5,103.3 -167.5,113.3
3D body: height 10, standoff 0, extent -177.5,83.61 -167.5,93.61
3D body: height 10, standoff 0, extent -177.5,-152.64 -167.5,-142.64
3D body: height 10, standoff 0, extent -177.5,-132.95 -167.5,-122.95
3D body: height 10, standoff 0, extent -177.5,-113.27 -167.5,-103.27
3D body: height 10, standoff 0, extent -177.5,-93.58 -167.5,-83.58
3D body: height 10, standoff 0, extent -177.5,-73.9 -167.5,-63.9
3D body: height 10, standoff 0, extent -177.5,-54.21 -167.5,-44.21
3D body: height 10, standoff 0, extent -177.5,-34.53 -167.5,-24.53
3D body: height 10, standoff 0, extent -177.5,-14.84 -167.5,-4.84
3D body: height 10, standoff 0, extent -177.5,4.84 -167.5,14.84
3D body: height 10, standoff 0, extent -177.5,24.53 -167.5,34.53
3D body: height 10, standoff 0, extent -177.5,44.21 -167.5,54.21
3D body: height 10, standoff 0, extent -177.5,63.9 -167.5,73.9
3D body: height 10, standoff 0, extent 122.98,167.5 132.98,177.5
3D body: height 10, standoff 0, extent 142.67,167.5 152.67,177.5
3D body: height 10, standoff 0, extent 103.3,167.5 113.3,177.5
3D body: height 10, standoff 0, extent 83.61,167.5 93.61,177.5
3D body: height 10, standoff 0, extent -152.64,167.5 -142.64,177.5
3D body: height 10, standoff 0, extent -132.95,167.5 -122.95,177.5
3D body: height 10, standoff 0, extent -113.27,167.5 -103.27,177.5
3D body: height 10, standoff 0, extent -93.58,167.5 -83.58,177.5
3D body: height 10, standoff 0, extent -73.9,167.5 -63.9,177.5
3D body: height 10, standoff 0, extent -54.21,167.5 -44.21,177.5
3D body: height 10, standoff 0, extent -34.53,167.5 -24.53,177.5
3D body: height 10, standoff 0, extent -14.84,167.5 -4.84,177.5
3D body: height 10, standoff 0, extent 4.84,167.5 14.84,177.5
3D body: height 10, standoff 0, extent 24.53,167.5 34.53,177.5
3D body: height 10, standoff 0, extent 44.21,167.5 54.21,177.5
3D body: height 10, standoff 0, extent 63.9,167.5 73.9,177.5
3D body: height 10, standoff 0, extent 167.5,-73.9 177.5,-63.9
3D body: height 10, standoff 0, extent 167.5,-54.21 177.5,-44.21
3D body: height 10, standoff 0, extent 167.5,-34.53 177.5,-24.53
3D body: height 10, standoff 0, extent 167.5,-14.84 177.5,-4.84
3D body: height 10, standoff 0, extent 167.5,4.84 177.5,14.84
3D body: height 10, standoff 0, extent 167.5,24.53 177.5,34.53
3D body: height 10, standoff 0, extent 167.5,44.21 177.5,54.21
3D body: height 10, standoff 0, extent 167.5,63.9 177.5,73.9
3D body: height 10, standoff 0, extent 167.5,83.58 177.5,93.58
3D body: height 10, standoff 0, extent 167.5,103.27 177.5,113.27
3D body: height 10, standoff 0, extent 167.5,122.95 177.5,132.95
3D body: height 10, standoff 0, extent 167.5,142.64 177.5,152.64
3D body: height 10, standoff 0, extent 167.5,-93.61 177.5,-83.61
3D body: height 10, standoff 0, extent 167.5,-113.3 177.5,-103.3
3D body: height 10, standoff 0, extent 167.5,-152.67 177.5,-142.67
3D body: height 10, standoff 0, extent 167.5,-132.98 177.5,-122.98
3D body: height 35, standoff 0, extent -177.17,-177.17 177.17,177.17

## QFN_9_64_PAD7.2 [mil]
pads (65):
  oval 24x10 smd paste+0 mask+2: 1(-172.74,147.64) 2(-172.74,127.95) 3(-172.74,108.27) 4(-172.74,88.58) 5(-172.74,68.9) 6(-172.74,49.21) 7(-172.74,29.53) 8(-172.74,9.84) 9(-172.74,-9.84) 10(-172.74,-29.53) 11(-172.74,-49.21) 12(-172.74,-68.9) 13(-172.74,-88.58) 14(-172.74,-108.27) 15(-172.74,-127.95) 16(-172.74,-147.64) 33(172.74,-147.64) 34(172.74,-127.95) 35(172.74,-108.27) 36(172.74,-88.58) 37(172.74,-68.9) 38(172.74,-49.21) 39(172.74,-29.53) 40(172.74,-9.84) 41(172.74,9.84) 42(172.74,29.53) 43(172.74,49.21) 44(172.74,68.9) 45(172.74,88.58) 46(172.74,108.27) 47(172.74,127.95) 48(172.74,147.64)
  oval 10x24 smd paste+0 mask+2: 17(-147.64,-172.74) 18(-127.95,-172.74) 19(-108.27,-172.74) 20(-88.58,-172.74) 21(-68.9,-172.74) 22(-49.21,-172.74) 23(-29.53,-172.74) 24(-9.84,-172.74) 25(9.84,-172.74) 26(29.53,-172.74) 27(49.21,-172.74) 28(68.9,-172.74) 29(88.58,-172.74) 30(108.27,-172.74) 31(127.95,-172.74) 32(147.64,-172.74) 49(147.64,172.74) 50(127.95,172.74) 51(108.27,172.74) 52(88.58,172.74) 53(68.9,172.74) 54(49.21,172.74) 55(29.53,172.74) 56(9.84,172.74) 57(-9.84,172.74) 58(-29.53,172.74) 59(-49.21,172.74) 60(-68.9,172.74) 61(-88.58,172.74) 62(-108.27,172.74) 63(-127.95,172.74) 64(-147.64,172.74)
  rrect2% 283.46x283.46 smd paste-500 mask+2: P(0,0)
Top Layer:
  pour cut-out: 147.64,161.42 150.38,161.42 155.44,159.32 159.32,155.44 161.42,150.38 161.42,147.64 161.42,-147.64 161.42,-150.38 159.32,-155.44 155.44,-159.32 150.38,-161.42 147.64,-161.42 -147.64,-161.42 -150.38,-161.42 -155.44,-159.32 -159.32,-155.44 -161.42,-150.38 -161.42,-147.64 -161.42,147.64 -161.42,150.38 -159.32,155.44 -155.44,159.32 -150.38,161.42 -147.64,161.42
  region: -186.26,186.26 -190.5,203.23 -203.23,190.51
Top Paste:
  rectangle: -20,-20 20,20
  rectangle: 30,-20 70,20
  rectangle: 30,-70 70,-30
  rectangle: -20,-70 20,-30
  rectangle: -20,-130 20,-90
  rectangle: 30,-130 70,-90
  region: 70,30 70,70 30,70 30,30
  region: -30,70 -70,70 -70,30 -30,30
  region: -130,-90 -130,-130 -90,-130 -90,-90
  region: -70,-30 -70,-70 -30,-70 -30,-30
  region: -70,-90 -70,-130 -30,-130 -30,-90
  region: 20,70 -20,70 -20,30 20,30
  region: -70,20 -70,-20 -30,-20 -30,20
  rectangle: 90,-70 130,-30
  rectangle: 90,-130 130,-90
  region: 130,30 130,70 90,70 90,30
  region: 130,-20 130,20 90,20 90,-20
  region: 70,90 70,130 30,130 30,90
  region: 130,90 130,130 90,130 90,90
  region: -30,130 -70,130 -70,90 -30,90
  region: 20,130 -20,130 -20,90 20,90
  region: -90,70 -130,70 -130,30 -90,30
  region: -90,130 -130,130 -130,90 -90,90
  region: -130,-30 -130,-70 -90,-70 -90,-30
  region: -130,20 -130,-20 -90,-20 -90,20
Top Component Outline:
  lines w1: -205,-205 -205,205 205,205 205,-205 -205,-205
Top 3D Body (Mech16):
  lines w1: -177.17,-177.17 -177.17,177.17 177.17,177.17 177.17,-177.17 -177.17,-177.17
3D body: height 35, standoff 0, extent -177.17,-177.17 177.17,177.17
3D body: height 10, standoff 0, extent 167.5,-132.98 177.5,-122.98
3D body: height 10, standoff 0, extent 167.5,-152.67 177.5,-142.67
3D body: height 10, standoff 0, extent 167.5,-113.3 177.5,-103.3
3D body: height 10, standoff 0, extent 167.5,-93.61 177.5,-83.61
3D body: height 10, standoff 0, extent 167.5,142.64 177.5,152.64
3D body: height 10, standoff 0, extent 167.5,122.95 177.5,132.95
3D body: height 10, standoff 0, extent 167.5,103.27 177.5,113.27
3D body: height 10, standoff 0, extent 167.5,83.58 177.5,93.58
3D body: height 10, standoff 0, extent 167.5,63.9 177.5,73.9
3D body: height 10, standoff 0, extent 167.5,44.21 177.5,54.21
3D body: height 10, standoff 0, extent 167.5,24.53 177.5,34.53
3D body: height 10, standoff 0, extent 167.5,4.84 177.5,14.84
3D body: height 10, standoff 0, extent 167.5,-14.84 177.5,-4.84
3D body: height 10, standoff 0, extent 167.5,-34.53 177.5,-24.53
3D body: height 10, standoff 0, extent 167.5,-54.21 177.5,-44.21
3D body: height 10, standoff 0, extent 167.5,-73.9 177.5,-63.9
3D body: height 10, standoff 0, extent 63.9,167.5 73.9,177.5
3D body: height 10, standoff 0, extent 44.21,167.5 54.21,177.5
3D body: height 10, standoff 0, extent 24.53,167.5 34.53,177.5
3D body: height 10, standoff 0, extent 4.84,167.5 14.84,177.5
3D body: height 10, standoff 0, extent -14.84,167.5 -4.84,177.5
3D body: height 10, standoff 0, extent -34.53,167.5 -24.53,177.5
3D body: height 10, standoff 0, extent -54.21,167.5 -44.21,177.5
3D body: height 10, standoff 0, extent -73.9,167.5 -63.9,177.5
3D body: height 10, standoff 0, extent -93.58,167.5 -83.58,177.5
3D body: height 10, standoff 0, extent -113.27,167.5 -103.27,177.5
3D body: height 10, standoff 0, extent -132.95,167.5 -122.95,177.5
3D body: height 10, standoff 0, extent -152.64,167.5 -142.64,177.5
3D body: height 10, standoff 0, extent 83.61,167.5 93.61,177.5
3D body: height 10, standoff 0, extent 103.3,167.5 113.3,177.5
3D body: height 10, standoff 0, extent 142.67,167.5 152.67,177.5
3D body: height 10, standoff 0, extent 122.98,167.5 132.98,177.5
3D body: height 10, standoff 0, extent -177.5,63.9 -167.5,73.9
3D body: height 10, standoff 0, extent -177.5,44.21 -167.5,54.21
3D body: height 10, standoff 0, extent -177.5,24.53 -167.5,34.53
3D body: height 10, standoff 0, extent -177.5,4.84 -167.5,14.84
3D body: height 10, standoff 0, extent -177.5,-14.84 -167.5,-4.84
3D body: height 10, standoff 0, extent -177.5,-34.53 -167.5,-24.53
3D body: height 10, standoff 0, extent -177.5,-54.21 -167.5,-44.21
3D body: height 10, standoff 0, extent -177.5,-73.9 -167.5,-63.9
3D body: height 10, standoff 0, extent -177.5,-93.58 -167.5,-83.58
3D body: height 10, standoff 0, extent -177.5,-113.27 -167.5,-103.27
3D body: height 10, standoff 0, extent -177.5,-132.95 -167.5,-122.95
3D body: height 10, standoff 0, extent -177.5,-152.64 -167.5,-142.64
3D body: height 10, standoff 0, extent -177.5,83.61 -167.5,93.61
3D body: height 10, standoff 0, extent -177.5,103.3 -167.5,113.3
3D body: height 10, standoff 0, extent -177.5,142.67 -167.5,152.67
3D body: height 10, standoff 0, extent -177.5,122.98 -167.5,132.98
3D body: height 10, standoff 0, extent -73.9,-177.5 -63.9,-167.5
3D body: height 10, standoff 0, extent -54.21,-177.5 -44.21,-167.5
3D body: height 10, standoff 0, extent -34.53,-177.5 -24.53,-167.5
3D body: height 10, standoff 0, extent -14.84,-177.5 -4.84,-167.5
3D body: height 10, standoff 0, extent 4.84,-177.5 14.84,-167.5
3D body: height 10, standoff 0, extent 24.53,-177.5 34.53,-167.5
3D body: height 10, standoff 0, extent 44.21,-177.5 54.21,-167.5
3D body: height 10, standoff 0, extent 63.9,-177.5 73.9,-167.5
3D body: height 10, standoff 0, extent 83.58,-177.5 93.58,-167.5
3D body: height 10, standoff 0, extent 103.27,-177.5 113.27,-167.5
3D body: height 10, standoff 0, extent 122.95,-177.5 132.95,-167.5
3D body: height 10, standoff 0, extent 142.64,-177.5 152.64,-167.5
3D body: height 10, standoff 0, extent -93.61,-177.5 -83.61,-167.5
3D body: height 10, standoff 0, extent -113.3,-177.5 -103.3,-167.5
3D body: height 10, standoff 0, extent -152.67,-177.5 -142.67,-167.5
3D body: height 10, standoff 0, extent -132.98,-177.5 -122.98,-167.5

## QFN_10_68_PAD6.3 [mil]
pads (69):
  oval 30x10 smd paste+0 mask+2: 1(-192.91,157.48) 2(-192.91,137.8) 3(-192.91,118.11) 4(-192.91,98.43) 5(-192.91,78.74) 6(-192.91,59.06) 7(-192.91,39.37) 8(-192.91,19.68) 9(-192.91,0) 10(-192.91,-19.69) 11(-192.91,-39.37) 12(-192.91,-59.06) 13(-192.91,-78.74) 14(-192.91,-98.43) 15(-192.91,-118.11) 16(-192.91,-137.8) 17(-192.91,-157.48) 35(192.91,-157.48) 36(192.91,-137.8) 37(192.91,-118.11) 38(192.91,-98.43) 39(192.91,-78.74) 40(192.91,-59.06) 41(192.91,-39.37) 42(192.91,-19.68) 43(192.91,0) 44(192.91,19.68) 45(192.91,39.37) 46(192.91,59.06) 47(192.91,78.74) 48(192.91,98.43) 49(192.91,118.11) 50(192.91,137.8) 51(192.91,157.48)
  oval 10x30 smd paste+0 mask+2: 18(-157.48,-192.91) 19(-137.8,-192.91) 20(-118.11,-192.91) 21(-98.43,-192.91) 22(-78.74,-192.91) 23(-59.06,-192.91) 24(-39.37,-192.91) 25(-19.69,-192.91) 26(0,-192.91) 27(19.68,-192.91) 28(39.37,-192.91) 29(59.06,-192.91) 30(78.74,-192.91) 31(98.43,-192.91) 32(118.11,-192.91) 33(137.8,-192.91) 34(157.48,-192.91) 52(157.48,192.91) 53(137.8,192.91) 54(118.11,192.91) 55(98.43,192.91) 56(78.74,192.91) 57(59.06,192.91) 58(39.37,192.91) 59(19.68,192.91) 60(0,192.91) 61(-19.69,192.91) 62(-39.37,192.91) 63(-59.06,192.91) 64(-78.74,192.91) 65(-98.43,192.91) 66(-118.11,192.91) 67(-137.8,192.91) 68(-157.48,192.91)
  rrect2% 248.03x248.03 smd paste-500 mask+2: P(0,0)
Top Layer:
  region: -206.26,206.26 -210.5,223.23 -223.23,210.51
  pour cut-out: 177.17,167.32 177.17,169.28 175.67,172.9 172.9,175.67 169.28,177.17 167.32,177.17 -167.32,177.17 -169.28,177.17 -172.9,175.67 -175.67,172.9 -177.17,169.28 -177.17,167.32 -177.17,-167.32 -177.17,-169.28 -175.67,-172.9 -172.9,-175.67 -169.28,-177.17 -167.32,-177.17 167.32,-177.17 169.28,-177.17 172.9,-175.67 175.67,-172.9 177.17,-169.28 177.17,-167.32
Top Paste:
  rectangle: 55,-40 120,40
  rectangle: 55,55 120,120
  region: -40,-55 -40,-120 40,-120 40,-55
  region: 55,-55 55,-120 120,-120 120,-55
  region: -55,40 -120,40 -120,-40 -55,-40
  region: -55,-55 -120,-55 -120,-120 -55,-120
  region: 40,-40 40,40 -40,40 -40,-40
  region: -55,55 -55,120 -120,120 -120,55
  region: 40,55 40,120 -40,120 -40,55
Top Component Outline:
  lines w1: -225,-225 -225,225 225,225 225,-225 -225,-225
Top 3D Body (Mech16):
  lines w1: -196.85,-196.85 -196.85,196.85 196.85,196.85 196.85,-196.85 -196.85,-196.85
3D body: height 10, standoff 0, extent 187,-142.82 197,-132.82
3D body: height 10, standoff 0, extent 187,-162.51 197,-152.51
3D body: height 10, standoff 0, extent -162.51,-197 -152.51,-187
3D body: height 10, standoff 0, extent 187,-123.14 197,-113.14
3D body: height 10, standoff 0, extent 93.45,187 103.45,197
3D body: height 10, standoff 0, extent -103.45,-197 -93.45,-187
3D body: height 10, standoff 0, extent -123.14,-197 -113.14,-187
3D body: height 10, standoff 0, extent -83.77,-197 -73.77,-187
3D body: height 10, standoff 0, extent -64.08,-197 -54.08,-187
3D body: height 10, standoff 0, extent 152.48,-197 162.48,-187
3D body: height 10, standoff 0, extent 132.8,-197 142.8,-187
3D body: height 10, standoff 0, extent 113.11,-197 123.11,-187
3D body: height 10, standoff 0, extent 93.43,-197 103.43,-187
3D body: height 10, standoff 0, extent 73.74,-197 83.74,-187
3D body: height 10, standoff 0, extent 54.06,-197 64.06,-187
3D body: height 10, standoff 0, extent 34.37,-197 44.37,-187
3D body: height 10, standoff 0, extent 14.69,-197 24.69,-187
3D body: height 10, standoff 0, extent -5,-197 5,-187
3D body: height 10, standoff 0, extent -24.68,-197 -14.68,-187
3D body: height 10, standoff 0, extent -44.37,-197 -34.37,-187
3D body: height 10, standoff 0, extent -197,132.82 -187,142.82
3D body: height 10, standoff 0, extent -197,152.51 -187,162.51
3D body: height 10, standoff 0, extent -197,113.14 -187,123.14
3D body: height 10, standoff 0, extent -197,93.45 -187,103.45
3D body: height 10, standoff 0, extent -197,-142.8 -187,-132.8
3D body: height 10, standoff 0, extent -197,-123.11 -187,-113.11
3D body: height 10, standoff 0, extent -197,-103.43 -187,-93.43
3D body: height 10, standoff 0, extent -197,-83.74 -187,-73.74
3D body: height 10, standoff 0, extent -197,-64.06 -187,-54.06
3D body: height 10, standoff 0, extent -197,-44.37 -187,-34.37
3D body: height 10, standoff 0, extent -197,-24.69 -187,-14.69
3D body: height 10, standoff 0, extent -197,-5 -187,5
3D body: height 10, standoff 0, extent -197,14.68 -187,24.68
3D body: height 10, standoff 0, extent -197,34.37 -187,44.37
3D body: height 10, standoff 0, extent -197,54.05 -187,64.05
3D body: height 10, standoff 0, extent -197,73.74 -187,83.74
3D body: height 10, standoff 0, extent 54.08,187 64.08,197
3D body: height 10, standoff 0, extent 73.77,187 83.77,197
3D body: height 10, standoff 0, extent 34.4,187 44.4,197
3D body: height 10, standoff 0, extent 14.71,187 24.71,197
3D body: height 10, standoff 0, extent -162.48,187 -152.48,197
3D body: height 10, standoff 0, extent -142.8,187 -132.8,197
3D body: height 10, standoff 0, extent -123.11,187 -113.11,197
3D body: height 10, standoff 0, extent -103.43,187 -93.43,197
3D body: height 10, standoff 0, extent -83.74,187 -73.74,197
3D body: height 10, standoff 0, extent -64.06,187 -54.06,197
3D body: height 10, standoff 0, extent -44.37,187 -34.37,197
3D body: height 10, standoff 0, extent -24.69,187 -14.69,197
3D body: height 10, standoff 0, extent -5,187 5,197
3D body: height 10, standoff 0, extent 187,-24.68 197,-14.68
3D body: height 10, standoff 0, extent 187,-5 197,5
3D body: height 10, standoff 0, extent 187,14.69 197,24.69
3D body: height 10, standoff 0, extent 187,34.37 197,44.37
3D body: height 10, standoff 0, extent 187,54.06 197,64.06
3D body: height 10, standoff 0, extent 187,73.74 197,83.74
3D body: height 10, standoff 0, extent 187,93.43 197,103.43
3D body: height 10, standoff 0, extent 187,113.11 197,123.11
3D body: height 10, standoff 0, extent 187,132.8 197,142.8
3D body: height 10, standoff 0, extent 187,152.48 197,162.48
3D body: height 10, standoff 0, extent 187,-44.4 197,-34.4
3D body: height 10, standoff 0, extent 187,-64.08 197,-54.08
3D body: height 10, standoff 0, extent 187,-103.45 197,-93.45
3D body: height 10, standoff 0, extent 187,-83.77 197,-73.77
3D body: height 10, standoff 0, extent -197,-162.48 -187,-152.48
3D body: height 10, standoff 0, extent -142.82,-197 -132.82,-187
3D body: height 35, standoff 0, extent -196.85,-196.85 196.85,196.85
3D body: height 10, standoff 0, extent 132.82,187 142.82,197
3D body: height 10, standoff 0, extent 113.14,187 123.14,197
3D body: height 10, standoff 0, extent 152.51,187 162.51,197